# Altium footprint library Revo_connector_kisun.PcbLib: 90 footprints (part 5 of 6)
Each footprint in its own frame and in the unit in brackets; x right, y up, seen from the top. Pads: shape width x height; smd on the part's side, far side on the other; paste and mask are expansions set on the pad; w line width, h text height; cw(c..) or ccw(c..) is an arc to the next point about the centre after c.
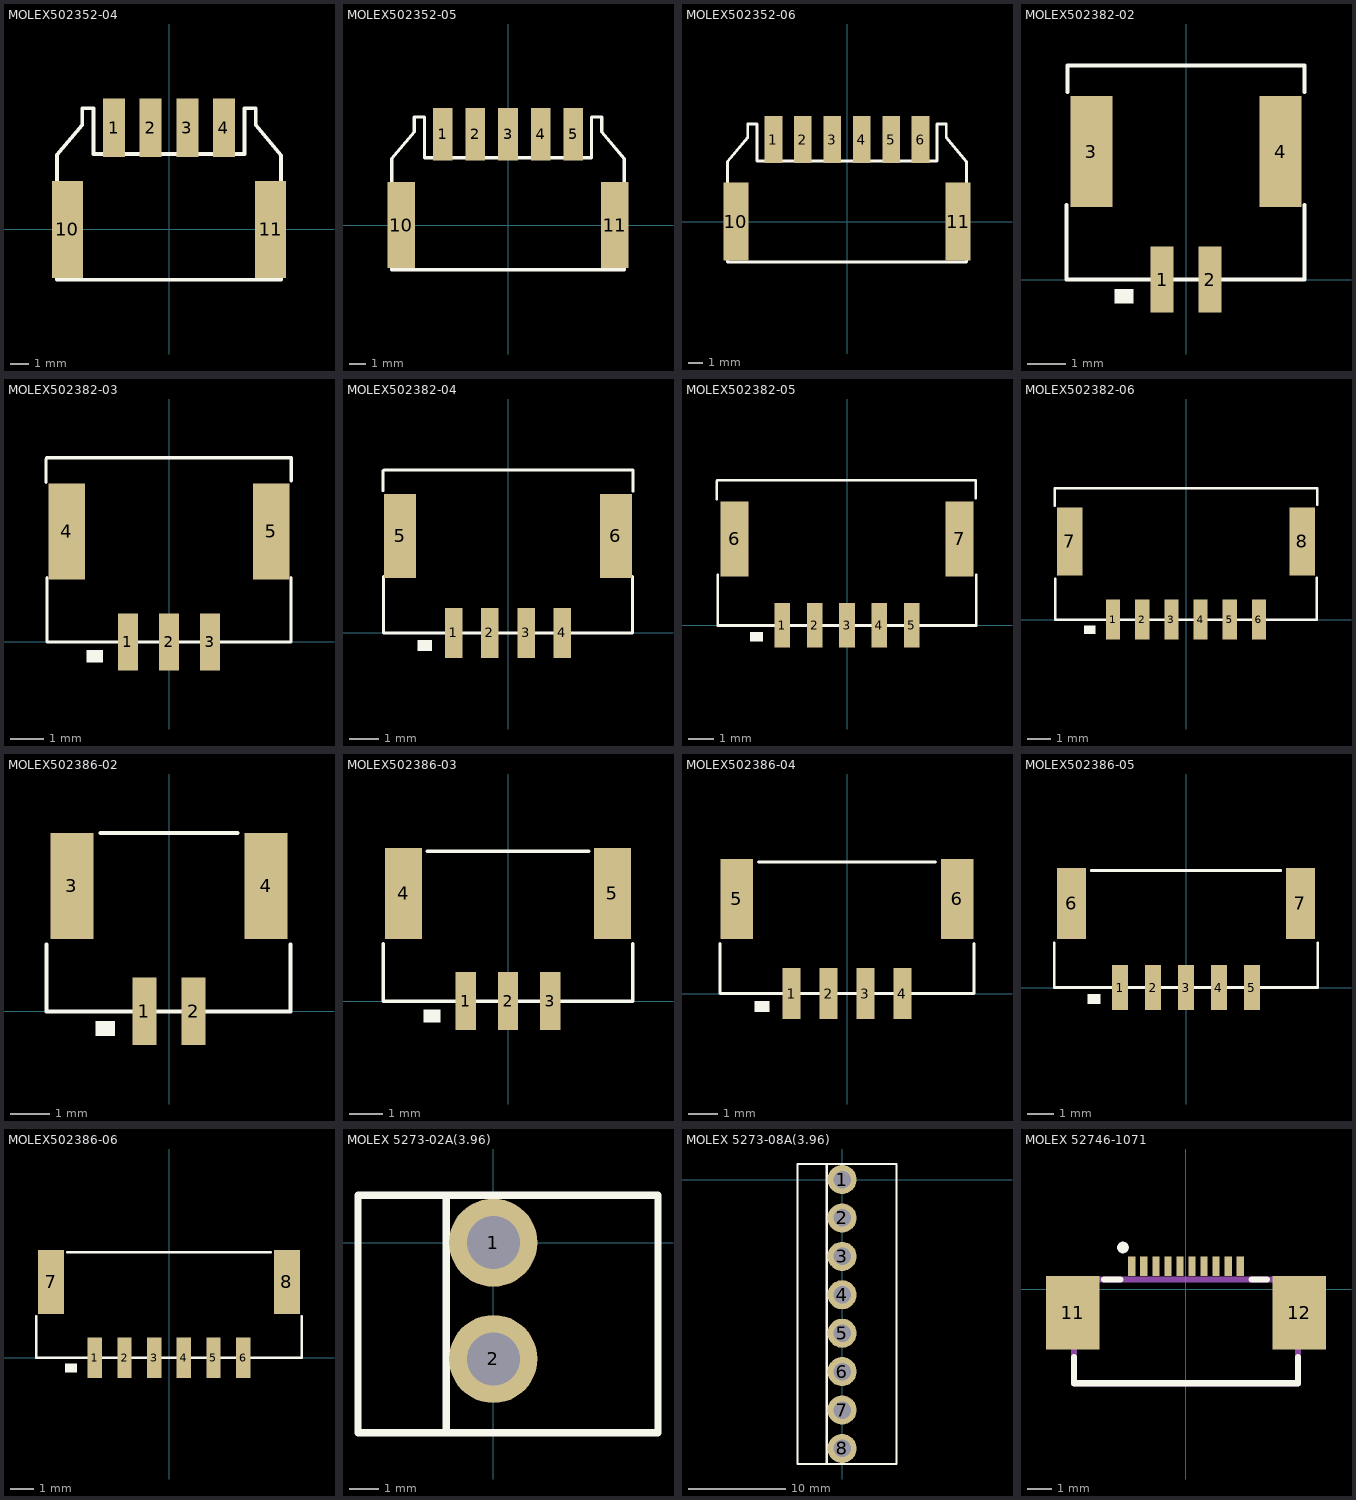
[diagram p4: the footprints below, top view; thin cyan lines are the x and y axes]

## MOLEX502352-04 [mm]
pads (6):
  rect 1.2x3.2 smd: 1(-3,5.57) 2(-1,5.57) 3(1,5.57) 4(3,5.57)
  rect 1.7x5.3 smd: 10(-5.55,0) 11(5.55,0)
Top Overlay:
  lines w0.2: -6.125,-2.75 -6.125,4.08 -4.75,5.705 -4.75,6.625 -4.125,6.625 -4.125,4.125 4.125,4.125 4.125,6.625 4.75,6.625 4.75,5.702 6.125,4.061 6.125,-2.75 -6.125,-2.75
3D body "5023520400.stp": height 6.46, standoff 0.06, extent -6,-2.6 6,6.8

## MOLEX502352-05 [mm]
pads (7):
  rect 1.2x3.2 smd: 1(-4,5.57) 2(-2,5.57) 3(0,5.57) 4(2,5.57) 5(4,5.57)
  rect 1.7x5.3 smd: 10(-6.55,0) 11(6.55,0)
Top Overlay:
  lines w0.2: -7.125,-2.75 -7.125,4.08 -5.75,5.705 -5.75,6.625 -5.125,6.625 -5.125,4.125 5.125,4.125 5.125,6.625 5.75,6.625 5.75,5.702 7.125,4.061 7.125,-2.75 -7.125,-2.75
3D body "5023520500.stp": height 6.35, standoff -0.05, extent -7,-2.75 7,6.65

## MOLEX502352-06 [mm]
pads (8):
  rect 1.2x3.2 smd: 1(-5,5.57) 2(-3,5.57) 3(-1,5.57) 4(1,5.57) 5(3,5.57) 6(5,5.57)
  rect 1.7x5.3 smd: 10(-7.55,0) 11(7.55,0)
Top Overlay:
  lines w0.2: -8.125,-2.75 8.125,-2.75 8.125,4.061 6.75,5.702 6.75,6.625 6.125,6.625 6.125,4.125 -6.125,4.125 -6.125,6.625 -6.75,6.625 -6.75,5.705 -8.125,4.08 -8.125,-2.75
3D body "5023520600.stp": height 6.46, standoff 0.06, extent -8,-2.725 8,6.675

## MOLEX502382-02 [mm]
pads (4):
  rect 0.605x1.72 smd: 1(-0.625,0) 2(0.625,0)
  rect 1.1x2.9 smd: 3(-2.475,3.35) 4(2.475,3.35)
Top Overlay:
  rectangle: -1.875,-0.625 -1.375,-0.25
  lines w0.1: -3.125,1.95 -3.125,0 3.1,0 3.1,1.95 ; -3.1,4.9 -3.1,5.6 3.1,5.6 3.1,4.9

## MOLEX502382-03 [mm]
pads (5):
  rect 0.605x1.72 smd: 1(-1.25,0) 2(0,0) 3(1.25,0)
  rect 1.1x2.9 smd: 4(-3.1,3.35) 5(3.1,3.35)
Top Overlay:
  rectangle: -2.5,-0.625 -2,-0.25
  lines w0.1: -3.734,4.837 -3.734,5.537 ; -3.717,5.588 3.683,5.588 ; -3.7,1.95 -3.7,0 3.7,0 3.7,1.95 ; 3.708,4.888 3.708,5.588

## MOLEX502382-04 [mm]
pads (6):
  rect 0.605x1.72 smd: 1(-1.875,0) 2(-0.625,0) 3(0.625,0) 4(1.875,0)
  rect 1.1x2.9 smd: 5(-3.725,3.35) 6(3.725,3.35)
Top Overlay:
  rectangle: -3.125,-0.625 -2.625,-0.25
  lines w0.1: -4.318,4.902 -4.318,5.602 ; -4.3,1.95 -4.3,0 4.3,0 4.3,1.95 ; -4.282,5.613 4.318,5.613 ; 4.318,4.888 4.318,5.588

## MOLEX502382-05 [mm]
pads (7):
  rect 0.605x1.72 smd: 1(-2.5,0) 2(-1.25,0) 3(0,0) 4(1.25,0) 5(2.5,0)
  rect 1.1x2.9 smd: 6(-4.35,3.35) 7(4.35,3.35)
Top Overlay:
  rectangle: -3.75,-0.625 -3.25,-0.25
  lines w0.1: -5.029,4.877 -5.029,5.577 ; -5.022,5.613 4.978,5.613 4.978,4.913 ; -5,1.95 -5,0 5,0 5,1.95

## MOLEX502382-06 [mm]
pads (8):
  rect 0.605x1.72 smd: 1(-3.125,0) 2(-1.875,0) 3(-0.625,0) 4(0.625,0) 5(1.875,0) 6(3.125,0)
  rect 1.1x2.9 smd: 7(-4.975,3.35) 8(4.975,3.35)
Top Overlay:
  rectangle: -4.375,-0.625 -3.875,-0.25
  lines w0.1: -5.625,4.875 -5.625,5.575 ; -5.625,5.625 5.575,5.625 ; -5.6,1.753 -5.6,0 5.6,0 5.6,1.803 ; 5.625,4.925 5.625,5.625

## MOLEX502386-02 [mm]
pads (4):
  rect 0.605x1.72 smd: 1(-0.625,0) 2(0.625,0)
  rect 1.1x2.7 smd: 3(-2.475,3.2) 4(2.475,3.2)
Top Overlay:
  rectangle: -1.875,-0.625 -1.375,-0.25
  lines w0.1: -3.125,1.7 -3.125,0 3.1,0 3.1,1.7 ; -1.75,4.55 1.75,4.55

## MOLEX502386-03 [mm]
pads (5):
  rect 0.605x1.72 smd: 1(-1.25,0) 2(0,0) 3(1.25,0)
  rect 1.1x2.7 smd: 4(-3.1,3.2) 5(3.1,3.2)
Top Overlay:
  rectangle: -2.5,-0.625 -2,-0.25
  lines w0.1: -3.7,1.7 -3.7,0 3.7,0 3.7,1.7 ; -2.4,4.45 2.4,4.45

## MOLEX502386-04 [mm]
pads (6):
  rect 0.605x1.72 smd: 1(-1.875,0) 2(-0.625,0) 3(0.625,0) 4(1.875,0)
  rect 1.1x2.7 smd: 5(-3.725,3.2) 6(3.725,3.2)
Top Overlay:
  rectangle: -3.125,-0.625 -2.625,-0.25
  lines w0.1: -4.3,1.7 -4.3,0 4.3,0 4.3,1.7 ; -3,4.45 3,4.45

## MOLEX502386-05 [mm]
pads (7):
  rect 0.605x1.72 smd: 1(-2.5,0) 2(-1.25,0) 3(0,0) 4(1.25,0) 5(2.5,0)
  rect 1.1x2.7 smd: 6(-4.35,3.2) 7(4.35,3.2)
Top Overlay:
  rectangle: -3.75,-0.625 -3.25,-0.25
  lines w0.1: -5,1.7 -5,0 5,0 5,1.7 ; -3.6,4.45 3.6,4.45

## MOLEX502386-06 [mm]
pads (8):
  rect 0.605x1.72 smd: 1(-3.125,0) 2(-1.875,0) 3(-0.625,0) 4(0.625,0) 5(1.875,0) 6(3.125,0)
  rect 1.1x2.7 smd: 7(-4.975,3.2) 8(4.975,3.2)
Top Overlay:
  rectangle: -4.375,-0.625 -3.875,-0.25
  lines w0.1: -5.6,1.75 -5.6,0 5.6,0 5.6,1.75 ; -4.3,4.45 4.3,4.45
3D body "5023860670.stp": height 5.53, standoff -0.03, extent -5.425,-0.55 5.425,4.45

## MOLEX 5273-02A(3.96) [mm]
pads (2):
  round 3 hole 1.8: 1(0,0) 2(0,-3.96)
Top Overlay:
  lines w0.254: -1.6,-6.46 -1.6,1.6 ; -4.6,-6.46 -4.6,1.6 5.6,1.6 5.6,-6.46 -4.6,-6.46

## MOLEX 5273-08A(3.96) [mm]
pads (8):
  round 3 hole 1.8: 1(0,0) 2(0,-3.96) 3(0,-7.92) 4(0,-11.88) 5(0,-15.84) 6(0,-19.8) 7(0,-23.76) 8(0,-27.72)
Top Overlay:
  lines w0.254: -1.6,-29.32 -1.6,1.6 ; -4.6,-29.32 -4.6,1.6 5.6,1.6 5.6,-29.32 -4.6,-29.32

## MOLEX 52746-1071 [mm]
pads (12):
  rect 0.3x0.8 smd: 1(-2.25,0.962) 2(-1.75,0.962) 3(-1.25,0.962) 4(-0.75,0.962) 5(-0.25,0.962) 6(0.25,0.962) 7(0.75,0.962) 8(1.25,0.962) 9(1.75,0.962) 10(2.25,0.962)
  rect 2.2x3.05 smd: 11(-4.7,-0.962) 12(4.7,-0.962)
Top Overlay:
  circle w0.254: c-2.615,1.738 r0.113
  lines w0.254: -4.65,-2.808 -4.65,-3.893 4.65,-3.893 4.65,-2.808 ; -3.408,0.406 -2.728,0.406 ; 2.724,0.406 3.361,0.406
Mechanical 13:
  lines w0.254: -4.65,-3.893 4.65,-3.893 4.65,0.406 -4.65,0.406 -4.65,-3.893
3D body "52746-1071.stp": height 2, standoff 0, extent -5.54,-5.323 5.56,1.277